# Altium footprint library Wurth_Elektronik_Electromechanic_Wire_to_Board_Connectors_rev16a.PCBLIB: 662 footprints (part 10 of 42)
Each footprint in its own frame and in the unit in brackets; x right, y up, seen from the top. Pads: shape width x height; smd on the part's side, far side on the other; paste and mask are expansions set on the pad; w line width, h text height; cw(c..) or ccw(c..) is an arc to the next point about the centre after c.
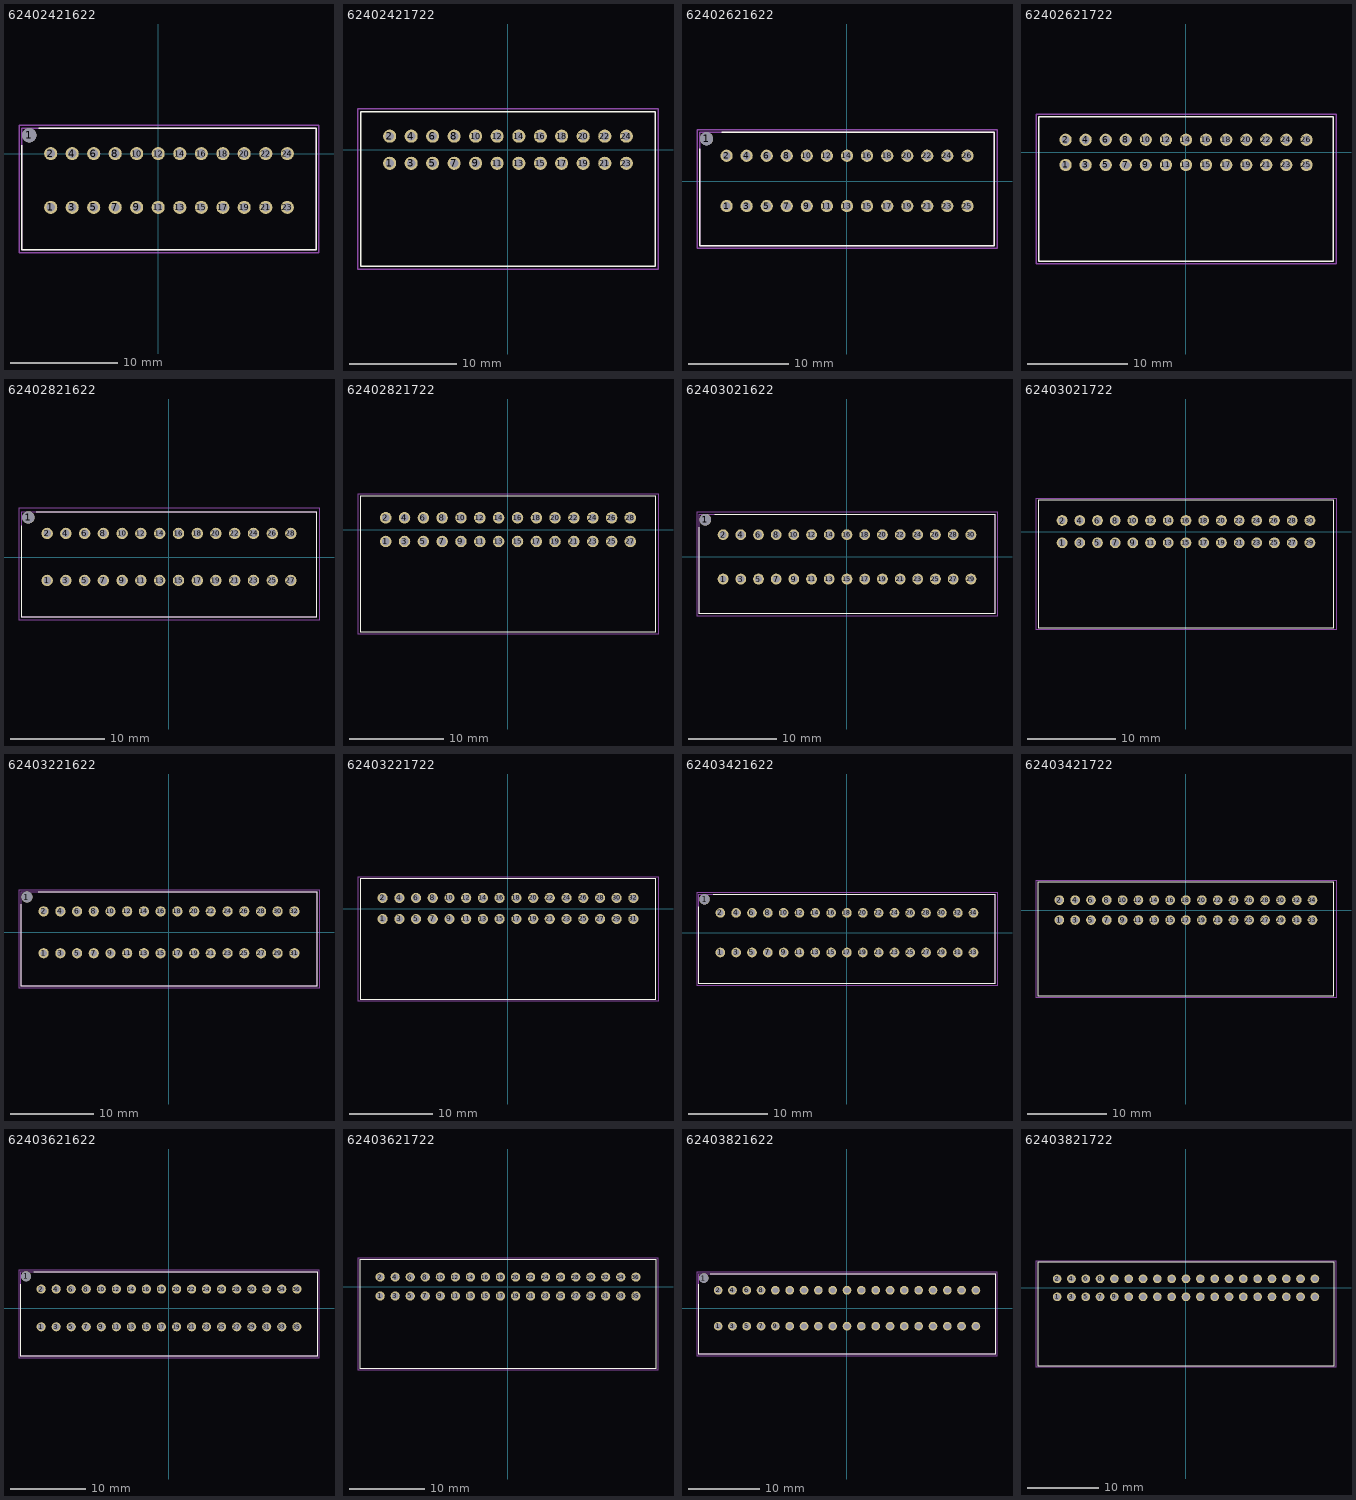
[diagram p9: the footprints below, top view; thin cyan lines are the x and y axes]

## 62402421622 [mil]
pads (25):
  round 52 hole 52: 1(-472.44,67)
  round 48 hole 32: 1(-393.7,-196.85) 2(-393.7,0) 3(-314.96,-196.85) 4(-314.96,0) 5(-236.22,-196.85) 6(-236.22,0) 7(-157.48,-196.85) 8(-157.48,0) 9(-78.74,-196.85) 10(-78.74,0) 11(0,-196.85) 12(0,0) 13(79,-196.85) 14(79,0) 15(158,-196.85) 16(158,0) 17(237,-196.85) 18(237,0) 19(315,-196.85) 20(315,0) 21(394,-196.85) 22(394,0) 23(473,-196.85) 24(473,0)
Top Overlay:
  lines w5: -500,30 -500,-352.36 579,-352.36 579,93 -436.61,93
Mechanical 2:
  text ">NAME" at -117.57,149 h77.5
Mechanical 4:
  text ">VALUE" at -129.35,-449.28 h77.5
Mechanical 16:
  lines w5: -500,-352.36 579,-352.36 579,93 -500,93 -500,-352.36
Mechanical 27:
  lines w5: -509.84,-362.2 589,-362.2 589,103 -509.84,103 -509.84,-362.2

## 62402421722 [mil]
pads (24):
  round 48 hole 32: 1(-433.07,-49.21) 2(-433.07,50) 3(-354.33,-49.21) 4(-354.33,50) 5(-275.59,-49.21) 6(-275.59,50) 7(-196.85,-49.21) 8(-196.85,50) 9(-118.11,-49.21) 10(-118.11,50) 11(-39.37,-49.21) 12(-39.37,50) 13(40,-49.21) 14(40,50) 15(119,-49.21) 16(119,50) 17(197,-49.21) 18(197,50) 19(276,-49.21) 20(276,50) 21(355,-49.21) 22(355,50) 23(434,-49.21) 24(434,50)
Top Overlay:
  lines w5: -539.37,-427.17 540,-427.17 540,140 -539.37,140 -539.37,-427.17
Mechanical 2:
  text ">NAME" at -129.92,191 h77.5
Mechanical 4:
  text ">VALUE" at -163.98,-507.87 h77.5
Mechanical 16:
  text "1" at -466.54,-55.12 h77.5
  text "24" at 427,63 h77.5
Mechanical 27:
  lines w5: -549.21,-437.01 550,-437.01 550,150 -549.21,150 -549.21,-437.01

## 62402621622 [mil]
pads (27):
  round 52 hole 52: 1(-551.18,166)
  round 48 hole 32: 1(-472.44,-98.43) 2(-472.44,99) 3(-393.7,-98.43) 4(-393.7,99) 5(-314.96,-98.43) 6(-314.96,99) 7(-236.22,-98.43) 8(-236.22,99) 9(-157.48,-98.43) 10(-157.48,99) 11(-78.74,-98.43) 12(-78.74,99) 13(0,-98.43) 14(0,99) 15(79,-98.43) 16(79,99) 17(158,-98.43) 18(158,99) 19(237,-98.43) 20(237,99) 21(315,-98.43) 22(315,99) 23(394,-98.43) 24(394,99) 25(473,-98.43) 26(473,99)
Top Overlay:
  lines w5: -578.74,127 -578.74,-253.94 579,-253.94 579,191 -491.34,191
Mechanical 2:
  text ">NAME" at -113.24,250 h77.5
Mechanical 4:
  text ">VALUE" at -77.38,-370.15 h77.5
Mechanical 16:
  lines w5: -578.74,-253.94 579,-253.94 579,191 -578.74,191 -578.74,-253.94
Mechanical 27:
  lines w5: -588.58,-263.78 589,-263.78 589,201 -588.58,201 -588.58,-263.78

## 62402621722 [mil]
pads (26):
  round 48 hole 32: 1(-472.44,-49.21) 2(-472.44,50) 3(-393.7,-49.21) 4(-393.7,50) 5(-314.96,-49.21) 6(-314.96,50) 7(-236.22,-49.21) 8(-236.22,50) 9(-157.48,-49.21) 10(-157.48,50) 11(-78.74,-49.21) 12(-78.74,50) 13(0,-49.21) 14(0,50) 15(79,-49.21) 16(79,50) 17(158,-49.21) 18(158,50) 19(237,-49.21) 20(237,50) 21(315,-49.21) 22(315,50) 23(394,-49.21) 24(394,50) 25(473,-49.21) 26(473,50)
Top Overlay:
  lines w5: -578.74,-427.17 579,-427.17 579,140 -578.74,140 -578.74,-427.17
Mechanical 2:
  text ">NAME" at -149.61,191 h77.5
Mechanical 4:
  text ">VALUE" at -183.66,-507.87 h77.5
Mechanical 16:
  text "1" at -505.91,-39.37 h77.5
  text "26" at 467,40 h77.5
Mechanical 27:
  lines w5: -588.58,-437.01 589,-437.01 589,150 -588.58,150 -588.58,-437.01

## 62402821622 [mil]
pads (29):
  round 52 hole 52: 1(-590.55,166)
  round 48 hole 32: 1(-511.81,-98.43) 2(-511.81,99) 3(-433.07,-98.43) 4(-433.07,99) 5(-354.33,-98.43) 6(-354.33,99) 7(-275.59,-98.43) 8(-275.59,99) 9(-196.85,-98.43) 10(-196.85,99) 11(-118.11,-98.43) 12(-118.11,99) 13(-39.37,-98.43) 14(-39.37,99) 15(40,-98.43) 16(40,99) 17(119,-98.43) 18(119,99) 19(197,-98.43) 20(197,99) 21(276,-98.43) 22(276,99) 23(355,-98.43) 24(355,99) 25(434,-98.43) 26(434,99) 27(512,-98.43) 28(512,99)
Top Overlay:
  lines w5: -618.11,131 -618.11,-253.94 619,-253.94 619,191 -557.87,191
Mechanical 2:
  text ">NAME" at -116.78,229 h77.5
Mechanical 4:
  text ">VALUE" at -101.79,-407.15 h77.5
Mechanical 16:
  lines w5: -618.11,-253.94 619,-253.94 619,191 -618.11,191 -618.11,-253.94
Mechanical 27:
  lines w5: -629.92,-265.75 630,-265.75 630,207 -629.92,207 -629.92,-265.75

## 62402821722 [mil]
pads (28):
  round 48 hole 32: 1(-511.81,-49.21) 2(-511.81,50) 3(-433.07,-49.21) 4(-433.07,50) 5(-354.33,-49.21) 6(-354.33,50) 7(-275.59,-49.21) 8(-275.59,50) 9(-196.85,-49.21) 10(-196.85,50) 11(-118.11,-49.21) 12(-118.11,50) 13(-39.37,-49.21) 14(-39.37,50) 15(40,-49.21) 16(40,50) 17(119,-49.21) 18(119,50) 19(197,-49.21) 20(197,50) 21(276,-49.21) 22(276,50) 23(355,-49.21) 24(355,50) 25(434,-49.21) 26(434,50) 27(512,-49.21) 28(512,50)
Top Overlay:
  lines w5: -618.11,-427.17 619,-427.17 619,140 -618.11,140 -618.11,-427.17
Mechanical 2:
  text ">NAME" at -169.29,191 h77.5
Mechanical 4:
  text ">VALUE" at -144.29,-507.87 h77.5
Mechanical 16:
  text "1" at -545.28,-39.37 h77.5
  text "28" at 506,40 h77.5
Mechanical 27:
  lines w5: -627.95,-437.01 628,-437.01 628,150 -627.95,150 -627.95,-437.01

## 62403021622 [mil]
pads (31):
  round 52 hole 52: 1(-629.92,166)
  round 48 hole 32: 1(-551.18,-98.43) 2(-551.18,99) 3(-472.44,-98.43) 4(-472.44,99) 5(-393.7,-98.43) 6(-393.7,99) 7(-314.96,-98.43) 8(-314.96,99) 9(-236.22,-98.43) 10(-236.22,99) 11(-157.48,-98.43) 12(-157.48,99) 13(-78.74,-98.43) 14(-78.74,99) 15(0,-98.43) 16(0,99) 17(79,-98.43) 18(79,99) 19(158,-98.43) 20(158,99) 21(237,-98.43) 22(237,99) 23(315,-98.43) 24(315,99) 25(394,-98.43) 26(394,99) 27(473,-98.43) 28(473,99) 29(552,-98.43) 30(552,99)
Top Overlay:
  lines w5: -657.48,132 -657.48,-253.94 658,-253.94 658,191 -588.19,191
Mechanical 2:
  text ">NAME" at -114.42,245 h77.5
Mechanical 4:
  text ">VALUE" at -136.83,-375.26 h77.5
Mechanical 16:
  lines w5: -657.48,-253.94 658,-253.94 658,191 -657.48,191 -657.48,-253.94
Mechanical 27:
  lines w5: -667.32,-263.78 668,-263.78 668,201 -667.32,201 -667.32,-263.78

## 62403021722 [mil]
pads (30):
  round 48 hole 32: 1(-551.18,-49.21) 2(-551.18,50) 3(-472.44,-49.21) 4(-472.44,50) 5(-393.7,-49.21) 6(-393.7,50) 7(-314.96,-49.21) 8(-314.96,50) 9(-236.22,-49.21) 10(-236.22,50) 11(-157.48,-49.21) 12(-157.48,50) 13(-78.74,-49.21) 14(-78.74,50) 15(0,-49.21) 16(0,50) 17(79,-49.21) 18(79,50) 19(158,-49.21) 20(158,50) 21(237,-49.21) 22(237,50) 23(315,-49.21) 24(315,50) 25(394,-49.21) 26(394,50) 27(473,-49.21) 28(473,50) 29(552,-49.21) 30(552,50)
Top Overlay:
  lines w5: -657.48,-427.17 658,-427.17 658,140 -657.48,140 -657.48,-427.17
Mechanical 2:
  text ">NAME" at -188.98,191 h77.5
Mechanical 4:
  text ">VALUE" at -179.72,-531.5 h77.5
Mechanical 16:
  text "1" at -584.65,-39.37 h77.5
  text "30" at 546,40 h77.5
Mechanical 27:
  lines w5: -667.32,-437.01 668,-437.01 668,150 -667.32,150 -667.32,-437.01

## 62403221622 [mil]
pads (33):
  round 52 hole 52: 1(-669.29,166)
  round 48 hole 32: 1(-590.55,-98.43) 2(-590.55,99) 3(-511.81,-98.43) 4(-511.81,99) 5(-433.07,-98.43) 6(-433.07,99) 7(-354.33,-98.43) 8(-354.33,99) 9(-275.59,-98.43) 10(-275.59,99) 11(-196.85,-98.43) 12(-196.85,99) 13(-118.11,-98.43) 14(-118.11,99) 15(-39.37,-98.43) 16(-39.37,99) 17(40,-98.43) 18(40,99) 19(119,-98.43) 20(119,99) 21(197,-98.43) 22(197,99) 23(276,-98.43) 24(276,99) 25(355,-98.43) 26(355,99) 27(434,-98.43) 28(434,99) 29(512,-98.43) 30(512,99) 31(591,-98.43) 32(591,99)
Top Overlay:
  lines w5: -696.85,132 -696.85,-253.94 697,-253.94 697,191 -615.35,191
Mechanical 2:
  text ">NAME" at -97.1,229 h77.5
Mechanical 4:
  text ">VALUE" at -121.47,-367.78 h77.5
Mechanical 16:
  lines w5: -696.85,-253.94 697,-253.94 697,191 -696.85,191 -696.85,-253.94
Mechanical 27:
  lines w5: -706.69,-263.78 707,-263.78 707,201 -706.69,201 -706.69,-263.78

## 62403221722 [mil]
pads (32):
  round 48 hole 32: 1(-590.55,-49.21) 2(-590.55,50) 3(-511.81,-49.21) 4(-511.81,50) 5(-433.07,-49.21) 6(-433.07,50) 7(-354.33,-49.21) 8(-354.33,50) 9(-275.59,-49.21) 10(-275.59,50) 11(-196.85,-49.21) 12(-196.85,50) 13(-118.11,-49.21) 14(-118.11,50) 15(-39.37,-49.21) 16(-39.37,50) 17(40,-49.21) 18(40,50) 19(119,-49.21) 20(119,50) 21(197,-49.21) 22(197,50) 23(276,-49.21) 24(276,50) 25(355,-49.21) 26(355,50) 27(434,-49.21) 28(434,50) 29(512,-49.21) 30(512,50) 31(591,-49.21) 32(591,50)
Top Overlay:
  lines w5: -696.85,-427.17 697,-427.17 697,140 -696.85,140 -696.85,-427.17
Mechanical 2:
  text ">NAME" at -181.1,191 h77.5
Mechanical 4:
  text ">VALUE" at -156.1,-515.75 h77.5
Mechanical 16:
  text "1" at -624.02,-39.37 h77.5
  text "32" at 585,40 h77.5
Mechanical 27:
  lines w5: -706.69,-437.01 707,-437.01 707,150 -706.69,150 -706.69,-437.01

## 62403421622 [mil]
pads (35):
  round 52 hole 52: 1(-708.66,166)
  round 48 hole 32: 1(-629.92,-98.43) 2(-629.92,99) 3(-551.18,-98.43) 4(-551.18,99) 5(-472.44,-98.43) 6(-472.44,99) 7(-393.7,-98.43) 8(-393.7,99) 9(-314.96,-98.43) 10(-314.96,99) 11(-236.22,-98.43) 12(-236.22,99) 13(-157.48,-98.43) 14(-157.48,99) 15(-78.74,-98.43) 16(-78.74,99) 17(0,-98.43) 18(0,99) 19(79,-98.43) 20(79,99) 21(158,-98.43) 22(158,99) 23(237,-98.43) 24(237,99) 25(315,-98.43) 26(315,99) 27(394,-98.43) 28(394,99) 29(473,-98.43) 30(473,99) 31(552,-98.43) 32(552,99) 33(630,-98.43) 34(630,99)
Top Overlay:
  lines w5: -736.22,128 -736.22,-253.94 737,-253.94 737,191 -666.14,191
Mechanical 2:
  text ">NAME" at -130.17,252 h77.5
Mechanical 4:
  text ">VALUE" at -141.95,-370.15 h77.5
Mechanical 16:
  lines w5: -736.22,-253.94 737,-253.94 737,191 -736.22,191 -736.22,-253.94
Mechanical 27:
  lines w5: -746.06,-263.78 747,-263.78 747,201 -746.06,201 -746.06,-263.78

## 62403421722 [mil]
pads (34):
  round 48 hole 32: 1(-629.92,-49.21) 2(-629.92,50) 3(-551.18,-49.21) 4(-551.18,50) 5(-472.44,-49.21) 6(-472.44,50) 7(-393.7,-49.21) 8(-393.7,50) 9(-314.96,-49.21) 10(-314.96,50) 11(-236.22,-49.21) 12(-236.22,50) 13(-157.48,-49.21) 14(-157.48,50) 15(-78.74,-49.21) 16(-78.74,50) 17(0,-49.21) 18(0,50) 19(79,-49.21) 20(79,50) 21(158,-49.21) 22(158,50) 23(237,-49.21) 24(237,50) 25(315,-49.21) 26(315,50) 27(394,-49.21) 28(394,50) 29(473,-49.21) 30(473,50) 31(552,-49.21) 32(552,50) 33(630,-49.21) 34(630,50)
Top Overlay:
  lines w5: -736.22,-427.17 737,-427.17 737,140 -736.22,140 -736.22,-427.17
Mechanical 2:
  text ">NAME" at -181.1,186 h77.5
Mechanical 4:
  text ">VALUE" at -156.1,-515.75 h77.5
Mechanical 16:
  text "1" at -663.39,-39.37 h77.5
  text "34" at 624,40 h77.5
Mechanical 27:
  lines w5: -746.06,-437.01 747,-437.01 747,150 -746.06,150 -746.06,-437.01

## 62403621622 [mil]
pads (37):
  round 52 hole 52: 1(-748.03,166)
  round 48 hole 32: 1(-669.29,-98.43) 2(-669.29,99) 3(-590.55,-98.43) 4(-590.55,99) 5(-511.81,-98.43) 6(-511.81,99) 7(-433.07,-98.43) 8(-433.07,99) 9(-354.33,-98.43) 10(-354.33,99) 11(-275.59,-98.43) 12(-275.59,99) 13(-196.85,-98.43) 14(-196.85,99) 15(-118.11,-98.43) 16(-118.11,99) 17(-39.37,-98.43) 18(-39.37,99) 19(40,-98.43) 20(40,99) 21(119,-98.43) 22(119,99) 23(197,-98.43) 24(197,99) 25(276,-98.43) 26(276,99) 27(355,-98.43) 28(355,99) 29(434,-98.43) 30(434,99) 31(512,-98.43) 32(512,99) 33(591,-98.43) 34(591,99) 35(670,-98.43) 36(670,99)
Top Overlay:
  lines w5: -775.59,125 -775.59,-253.94 776,-253.94 776,191 -708.66,191
Mechanical 2:
  text ">NAME" at -186.47,238 h77.5
Mechanical 4:
  text ">VALUE" at -198.64,-352.43 h77.5
Mechanical 16:
  lines w5: -775.59,-253.94 776,-253.94 776,191 -775.59,191 -775.59,-253.94
Mechanical 27:
  lines w5: -785.43,-263.78 786,-263.78 786,201 -785.43,201 -785.43,-263.78

## 62403621722 [mil]
pads (36):
  round 48 hole 32: 1(-669.29,-49.21) 2(-669.29,50) 3(-590.55,-49.21) 4(-590.55,50) 5(-511.81,-49.21) 6(-511.81,50) 7(-433.07,-49.21) 8(-433.07,50) 9(-354.33,-49.21) 10(-354.33,50) 11(-275.59,-49.21) 12(-275.59,50) 13(-196.85,-49.21) 14(-196.85,50) 15(-118.11,-49.21) 16(-118.11,50) 17(-39.37,-49.21) 18(-39.37,50) 19(40,-49.21) 20(40,50) 21(119,-49.21) 22(119,50) 23(197,-49.21) 24(197,50) 25(276,-49.21) 26(276,50) 27(355,-49.21) 28(355,50) 29(434,-49.21) 30(434,50) 31(512,-49.21) 32(512,50) 33(591,-49.21) 34(591,50) 35(670,-49.21) 36(670,50)
Top Overlay:
  lines w5: -775.59,-427.17 776,-427.17 776,140 -775.59,140 -775.59,-427.17
Mechanical 2:
  text ">NAME" at -212.6,191 h77.5
Mechanical 4:
  text ">VALUE" at -140.35,-531.5 h77.5
Mechanical 16:
  text "1" at -702.76,-39.37 h77.5
  text "36" at 664,40 h77.5
Mechanical 27:
  lines w5: -785.43,-437.01 786,-437.01 786,150 -785.43,150 -785.43,-437.01

## 62403821622 [mil]
pads (39):
  round 52 hole 52: 1(-787.4,166)
  round 48 hole 32: 1(-708.66,-98.43) 2(-708.66,99) 3(-629.92,-98.43) 4(-629.92,99) 5(-551.18,-98.43) 6(-551.18,99) 7(-472.44,-98.43) 8(-472.44,99) 9(-393.7,-98.43) 10(-393.7,99) 11(-314.96,-98.43) 12(-314.96,99) 13(-236.22,-98.43) 14(-236.22,99) 15(-157.48,-98.43) 16(-157.48,99) 17(-78.74,-98.43) 18(-78.74,99) 19(0,-98.43) 20(0,99) 21(79,-98.43) 22(79,99) 23(158,-98.43) 24(158,99) 25(237,-98.43) 26(237,99) 27(315,-98.43) 28(315,99) 29(394,-98.43) 30(394,99) 31(473,-98.43) 32(473,99) 33(552,-98.43) 34(552,99) 35(630,-98.43) 36(630,99) 37(709,-98.43) 38(709,99)
Top Overlay:
  lines w5: -814.96,132 -814.96,-253.94 815,-253.94 815,191 -750.79,191
Mechanical 2:
  text ">NAME" at -102.21,246 h77.5
Mechanical 4:
  text ">VALUE" at -125.02,-367.39 h77.5
Mechanical 16:
  lines w5: -814.96,-253.94 815,-253.94 815,191 -814.96,191 -814.96,-253.94
Mechanical 27:
  lines w5: -824.8,-263.78 825,-263.78 825,201 -824.8,201 -824.8,-263.78

## 62403821722 [mil]
pads (38):
  round 48 hole 32: 1(-708.66,-49.21) 2(-708.66,50) 3(-629.92,-49.21) 4(-629.92,50) 5(-551.18,-49.21) 6(-551.18,50) 7(-472.44,-49.21) 8(-472.44,50) 9(-393.7,-49.21) 10(-393.7,50) 11(-314.96,-49.21) 12(-314.96,50) 13(-236.22,-49.21) 14(-236.22,50) 15(-157.48,-49.21) 16(-157.48,50) 17(-78.74,-49.21) 18(-78.74,50) 19(0,-49.21) 20(0,50) 21(79,-49.21) 22(79,50) 23(158,-49.21) 24(158,50) 25(237,-49.21) 26(237,50) 27(315,-49.21) 28(315,50) 29(394,-49.21) 30(394,50) 31(473,-49.21) 32(473,50) 33(552,-49.21) 34(552,50) 35(630,-49.21) 36(630,50) 37(709,-49.21) 38(709,50)
Top Overlay:
  lines w5: -814.96,-427.17 815,-427.17 815,140 -814.96,140 -814.96,-427.17
Mechanical 2:
  text ">NAME" at -236.22,207 h77.5
Mechanical 4:
  text ">VALUE" at -179.72,-515.75 h77.5
Mechanical 16:
  text "1" at -742.13,-39.37 h77.5
  text "38" at 703,40 h77.5
Mechanical 27:
  lines w5: -824.8,-437.01 825,-437.01 825,150 -824.8,150 -824.8,-437.01